# Altium schematic symbol library jlcpcb_2025_04_capacitors_extended_0402.schlib: 3594 symbols (part 18 of 20) (continued)
## TCC0402COG120K500AT
designator C?  Capacitance: 12pF  (hidden comment: *)
Capacitor, Ceramic (MLCC), 12pF, ±10%, 50V, C0G, ±10%, SMD 0402; Manufacturer: CCTC; Manufacturer Part Number: TCC0402COG120K500AT; Package Size: 0402; JLCPCB Basic Part: No; JLCPCB Part Number: C696905; Supplier 1: LCSC; Category: Capacitors - MLCC; Supplier Part Number 1: C696905; Tolerance: ±10%; Voltage Rating: 50V; Temperature Coefficient: C0G; RoHS: Yes; ComponentLink1Description: Datasheet; ComponentLink1URL: https://wmsc.lcsc.com/wmsc/upload/file/pdf/v2/lcsc/2304140030_CCTC-TCC0402COG120K500AT_C696905.pdf; ComponentLink2Description: JLCPCB Part URL; ComponentLink2URL: https://jlcpcb.com/partdetail/C696905; ComponentLink3Description: LCSC Part URL; ComponentLink3URL: https://lcsc.com/product-detail/Multilayer-Ceramic-Capacitors-MLCC---SMD-SMT_CCTC-CCTC-TCC0402COG120K500AT_C696905.html
footprint CAP-0402 (0402 (1005M) Capacitor)
pins: 1, 2

## TCC0402COG121J500AT
designator C?  Capacitance: 120pF  (hidden comment: *)
Capacitor, Ceramic (MLCC), 120pF, ±5%, 50V, ±5%, SMD 0402; Manufacturer: CCTC; Manufacturer Part Number: TCC0402COG121J500AT; Package Size: 0402; JLCPCB Basic Part: No; JLCPCB Part Number: C2887023; Supplier 1: LCSC; Category: Capacitors - MLCC; Supplier Part Number 1: C2887023; Tolerance: ±5%; Voltage Rating: 50V; RoHS: Yes; ComponentLink1Description: Datasheet; ComponentLink1URL: https://wmsc.lcsc.com/wmsc/upload/file/pdf/v2/lcsc/2108201430_CCTC-TCC0402COG121J500AT_C2887023.pdf; ComponentLink2Description: JLCPCB Part URL; ComponentLink2URL: https://jlcpcb.com/partdetail/C2887023; ComponentLink3Description: LCSC Part URL; ComponentLink3URL: https://lcsc.com/product-detail/Multilayer-Ceramic-Capacitors-MLCC---SMD-SMT_CCTC-CCTC-TCC0402COG121J500AT_C2887023.html
footprint CAP-0402 (0402 (1005M) Capacitor)
pins: 1, 2

## TCC0402COG150G500AT
designator C?  Capacitance: 15pF  (hidden comment: *)
Capacitor, Ceramic (MLCC), 15pF, ±2%, 50V, null, ±2%, SMD 0402; Manufacturer: CCTC; Manufacturer Part Number: TCC0402COG150G500AT; Package Size: 0402; JLCPCB Basic Part: No; JLCPCB Part Number: C5448865; Supplier 1: LCSC; Category: Capacitors - MLCC; Supplier Part Number 1: C5448865; Tolerance: ±2%; Voltage Rating: 50V; Temperature Coefficient: null; RoHS: Yes; ComponentLink1Description: Datasheet; ComponentLink2Description: JLCPCB Part URL; ComponentLink2URL: https://jlcpcb.com/partdetail/C5448865; ComponentLink3Description: LCSC Part URL; ComponentLink3URL: https://lcsc.com/product-detail/Multilayer-Ceramic-Capacitors-MLCC---SMD-SMT_CCTC-CCTC-TCC0402COG150G500AT_C5448865.html
footprint CAP-0402 (0402 (1005M) Capacitor)
pins: 1, 2

## TCC0402COG151J500AT
designator C?  Capacitance: 150pF  (hidden comment: *)
Capacitor, Ceramic (MLCC), 150pF, ±5%, 50V, C0G, ±5%, SMD 0402; Manufacturer: CCTC; Manufacturer Part Number: TCC0402COG151J500AT; Package Size: 0402; JLCPCB Basic Part: No; JLCPCB Part Number: C2994651; Supplier 1: LCSC; Category: Capacitors - MLCC; Supplier Part Number 1: C2994651; Tolerance: ±5%; Voltage Rating: 50V; Temperature Coefficient: C0G; RoHS: Yes; ComponentLink1Description: Datasheet; ComponentLink1URL: https://wmsc.lcsc.com/wmsc/upload/file/pdf/v2/lcsc/2204121745_CCTC-TCC0402COG151J500AT_C2994651.pdf; ComponentLink2Description: JLCPCB Part URL; ComponentLink2URL: https://jlcpcb.com/partdetail/C2994651; ComponentLink3Description: LCSC Part URL; ComponentLink3URL: https://lcsc.com/product-detail/Multilayer-Ceramic-Capacitors-MLCC---SMD-SMT_CCTC-CCTC-TCC0402COG151J500AT_C2994651.html
footprint CAP-0402 (0402 (1005M) Capacitor)
pins: 1, 2

## TCC0402COG160J500AT
designator C?  Capacitance: 16pF  (hidden comment: *)
Capacitor, Ceramic (MLCC), 16pF, ±5%, 50V, C0G, ±5%, SMD 0402; Manufacturer: CCTC; Manufacturer Part Number: TCC0402COG160J500AT; Package Size: 0402; JLCPCB Basic Part: No; JLCPCB Part Number: C5142569; Supplier 1: LCSC; Category: Capacitors - MLCC; Supplier Part Number 1: C5142569; Tolerance: ±5%; Voltage Rating: 50V; Temperature Coefficient: C0G; RoHS: Yes; ComponentLink1Description: Datasheet; ComponentLink1URL: https://wmsc.lcsc.com/wmsc/upload/file/pdf/v2/lcsc/2209011730_CCTC-TCC0402COG160J500AT_C5142569.pdf; ComponentLink2Description: JLCPCB Part URL; ComponentLink2URL: https://jlcpcb.com/partdetail/C5142569; ComponentLink3Description: LCSC Part URL; ComponentLink3URL: https://lcsc.com/product-detail/Multilayer-Ceramic-Capacitors-MLCC---SMD-SMT_CCTC-CCTC-TCC0402COG160J500AT_C5142569.html
footprint CAP-0402 (0402 (1005M) Capacitor)
pins: 1, 2

## TCC0402COG180J500AT
designator C?  Capacitance: 18pF  (hidden comment: *)
Capacitor, Ceramic (MLCC), 18pF, ±5%, 50V, C0G, ±5%, SMD 0402; Manufacturer: CCTC; Manufacturer Part Number: TCC0402COG180J500AT; Package Size: 0402; JLCPCB Basic Part: No; JLCPCB Part Number: C880644; Supplier 1: LCSC; Category: Capacitors - MLCC; Supplier Part Number 1: C880644; Tolerance: ±5%; Voltage Rating: 50V; Temperature Coefficient: C0G; RoHS: Yes; ComponentLink1Description: Datasheet; ComponentLink1URL: https://wmsc.lcsc.com/wmsc/upload/file/pdf/v2/lcsc/2304140030_CCTC-TCC0402COG180J500AT_C880644.pdf; ComponentLink2Description: JLCPCB Part URL; ComponentLink2URL: https://jlcpcb.com/partdetail/C880644; ComponentLink3Description: LCSC Part URL; ComponentLink3URL: https://lcsc.com/product-detail/Multilayer-Ceramic-Capacitors-MLCC---SMD-SMT_CCTC-CCTC-TCC0402COG180J500AT_C880644.html
footprint CAP-0402 (0402 (1005M) Capacitor)
pins: 1, 2

## TCC0402COG180K500AT
designator C?  Capacitance: 18pF  (hidden comment: *)
Capacitor, Ceramic (MLCC), 18pF, ±10%, 50V, null, ±10%, SMD 0402; Manufacturer: CCTC; Manufacturer Part Number: TCC0402COG180K500AT; Package Size: 0402; JLCPCB Basic Part: No; JLCPCB Part Number: C7393840; Supplier 1: LCSC; Category: Capacitors - MLCC; Supplier Part Number 1: C7393840; Tolerance: ±10%; Voltage Rating: 50V; Temperature Coefficient: null; RoHS: Yes; ComponentLink1Description: Datasheet; ComponentLink1URL: https://wmsc.lcsc.com/wmsc/upload/file/pdf/v2/lcsc/2306211554_CCTC-TCC0402COG180K500AT_C7393840.pdf; ComponentLink2Description: JLCPCB Part URL; ComponentLink2URL: https://jlcpcb.com/partdetail/C7393840; ComponentLink3Description: LCSC Part URL; ComponentLink3URL: https://lcsc.com/product-detail/Multilayer-Ceramic-Capacitors-MLCC---SMD-SMT_CCTC-CCTC-TCC0402COG180K500AT_C7393840.html
footprint CAP-0402 (0402 (1005M) Capacitor)
pins: 1, 2

## TCC0402COG200J500AT
designator C?  Capacitance: 20pF  (hidden comment: *)
Capacitor, Ceramic (MLCC), 20pF, ±5%, 50V, C0G, ±5%, SMD 0402; Manufacturer: CCTC; Manufacturer Part Number: TCC0402COG200J500AT; Package Size: 0402; JLCPCB Basic Part: No; JLCPCB Part Number: C880615; Supplier 1: LCSC; Category: Capacitors - MLCC; Supplier Part Number 1: C880615; Tolerance: ±5%; Voltage Rating: 50V; Temperature Coefficient: C0G; RoHS: Yes; ComponentLink1Description: Datasheet; ComponentLink1URL: https://wmsc.lcsc.com/wmsc/upload/file/pdf/v2/lcsc/2304140030_CCTC-TCC0402COG200J500AT_C880615.pdf; ComponentLink2Description: JLCPCB Part URL; ComponentLink2URL: https://jlcpcb.com/partdetail/C880615; ComponentLink3Description: LCSC Part URL; ComponentLink3URL: https://lcsc.com/product-detail/Multilayer-Ceramic-Capacitors-MLCC---SMD-SMT_CCTC-CCTC-TCC0402COG200J500AT_C880615.html
footprint CAP-0402 (0402 (1005M) Capacitor)
pins: 1, 2

## TCC0402COG200K500AT
designator C?  Capacitance: 20pF  (hidden comment: *)
Capacitor, Ceramic (MLCC), 20pF, ±10%, 50V, C0G, ±10%, SMD 0402; Manufacturer: CCTC; Manufacturer Part Number: TCC0402COG200K500AT; Package Size: 0402; JLCPCB Basic Part: No; JLCPCB Part Number: C696863; Supplier 1: LCSC; Category: Capacitors - MLCC; Supplier Part Number 1: C696863; Tolerance: ±10%; Voltage Rating: 50V; Temperature Coefficient: C0G; RoHS: Yes; ComponentLink1Description: Datasheet; ComponentLink1URL: https://wmsc.lcsc.com/wmsc/upload/file/pdf/v2/lcsc/2304140030_CCTC-TCC0402COG200K500AT_C696863.pdf; ComponentLink2Description: JLCPCB Part URL; ComponentLink2URL: https://jlcpcb.com/partdetail/C696863; ComponentLink3Description: LCSC Part URL; ComponentLink3URL: https://lcsc.com/product-detail/Multilayer-Ceramic-Capacitors-MLCC---SMD-SMT_CCTC-CCTC-TCC0402COG200K500AT_C696863.html
footprint CAP-0402 (0402 (1005M) Capacitor)
pins: 1, 2

## TCC0402COG220J500AT
designator C?  Capacitance: 22pF  (hidden comment: *)
Capacitor, Ceramic (MLCC), 22pF, ±5%, 50V, C0G, ±5%, SMD 0402; Manufacturer: CCTC; Manufacturer Part Number: TCC0402COG220J500AT; Package Size: 0402; JLCPCB Basic Part: No; JLCPCB Part Number: C696857; Supplier 1: LCSC; Category: Capacitors - MLCC; Supplier Part Number 1: C696857; Tolerance: ±5%; Voltage Rating: 50V; Temperature Coefficient: C0G; RoHS: Yes; ComponentLink1Description: Datasheet; ComponentLink1URL: https://wmsc.lcsc.com/wmsc/upload/file/pdf/v2/lcsc/2304140030_CCTC-TCC0402COG220J500AT_C696857.pdf; ComponentLink2Description: JLCPCB Part URL; ComponentLink2URL: https://jlcpcb.com/partdetail/C696857; ComponentLink3Description: LCSC Part URL; ComponentLink3URL: https://lcsc.com/product-detail/Multilayer-Ceramic-Capacitors-MLCC---SMD-SMT_CCTC-CCTC-TCC0402COG220J500AT_C696857.html
footprint CAP-0402 (0402 (1005M) Capacitor)
pins: 1, 2

## TCC0402COG220K500AT
designator C?  Capacitance: 22pF  (hidden comment: *)
Capacitor, Ceramic (MLCC), 22pF, ±10%, 50V, C0G, ±10%, SMD 0402; Manufacturer: CCTC; Manufacturer Part Number: TCC0402COG220K500AT; Package Size: 0402; JLCPCB Basic Part: No; JLCPCB Part Number: C696906; Supplier 1: LCSC; Category: Capacitors - MLCC; Supplier Part Number 1: C696906; Tolerance: ±10%; Voltage Rating: 50V; Temperature Coefficient: C0G; RoHS: Yes; ComponentLink1Description: Datasheet; ComponentLink1URL: https://wmsc.lcsc.com/wmsc/upload/file/pdf/v2/lcsc/2304140030_CCTC-TCC0402COG220K500AT_C696906.pdf; ComponentLink2Description: JLCPCB Part URL; ComponentLink2URL: https://jlcpcb.com/partdetail/C696906; ComponentLink3Description: LCSC Part URL; ComponentLink3URL: https://lcsc.com/product-detail/Multilayer-Ceramic-Capacitors-MLCC---SMD-SMT_CCTC-CCTC-TCC0402COG220K500AT_C696906.html
footprint CAP-0402 (0402 (1005M) Capacitor)
pins: 1, 2

## TCC0402COG221J500AT
designator C?  Capacitance: 220pF  (hidden comment: *)
Capacitor, Ceramic (MLCC), 220pF, ±5%, 50V, C0G, ±5%, SMD 0402; Manufacturer: CCTC; Manufacturer Part Number: TCC0402COG221J500AT; Package Size: 0402; JLCPCB Basic Part: No; JLCPCB Part Number: C2994655; Supplier 1: LCSC; Category: Capacitors - MLCC; Supplier Part Number 1: C2994655; Tolerance: ±5%; Voltage Rating: 50V; Temperature Coefficient: C0G; RoHS: Yes; ComponentLink1Description: Datasheet; ComponentLink1URL: https://wmsc.lcsc.com/wmsc/upload/file/pdf/v2/lcsc/2204121745_CCTC-TCC0402COG221J500AT_C2994655.pdf; ComponentLink2Description: JLCPCB Part URL; ComponentLink2URL: https://jlcpcb.com/partdetail/C2994655; ComponentLink3Description: LCSC Part URL; ComponentLink3URL: https://lcsc.com/product-detail/Multilayer-Ceramic-Capacitors-MLCC---SMD-SMT_CCTC-CCTC-TCC0402COG221J500AT_C2994655.html
footprint CAP-0402 (0402 (1005M) Capacitor)
pins: 1, 2

## TCC0402COG240J500AT
designator C?  Capacitance: 24pF  (hidden comment: *)
Capacitor, Ceramic (MLCC), 24pF, ±5%, 50V, C0G, ±5%, SMD 0402; Manufacturer: CCTC; Manufacturer Part Number: TCC0402COG240J500AT; Package Size: 0402; JLCPCB Basic Part: No; JLCPCB Part Number: C696899; Supplier 1: LCSC; Category: Capacitors - MLCC; Supplier Part Number 1: C696899; Tolerance: ±5%; Voltage Rating: 50V; Temperature Coefficient: C0G; RoHS: Yes; ComponentLink1Description: Datasheet; ComponentLink1URL: https://wmsc.lcsc.com/wmsc/upload/file/pdf/v2/lcsc/2304140030_CCTC-TCC0402COG240J500AT_C696899.pdf; ComponentLink2Description: JLCPCB Part URL; ComponentLink2URL: https://jlcpcb.com/partdetail/C696899; ComponentLink3Description: LCSC Part URL; ComponentLink3URL: https://lcsc.com/product-detail/Multilayer-Ceramic-Capacitors-MLCC---SMD-SMT_CCTC-CCTC-TCC0402COG240J500AT_C696899.html
footprint CAP-0402 (0402 (1005M) Capacitor)
pins: 1, 2

## TCC0402COG250J500AT
designator C?  Capacitance: 25pF  (hidden comment: *)
Capacitor, Ceramic (MLCC), 25pF, ±5%, 50V, C0G, ±5%, SMD 0402; Manufacturer: CCTC; Manufacturer Part Number: TCC0402COG250J500AT; Package Size: 0402; JLCPCB Basic Part: No; JLCPCB Part Number: C696896; Supplier 1: LCSC; Category: Capacitors - MLCC; Supplier Part Number 1: C696896; Tolerance: ±5%; Voltage Rating: 50V; Temperature Coefficient: C0G; RoHS: Yes; ComponentLink1Description: Datasheet; ComponentLink1URL: https://wmsc.lcsc.com/wmsc/upload/file/pdf/v2/lcsc/2304140030_CCTC-TCC0402COG250J500AT_C696896.pdf; ComponentLink2Description: JLCPCB Part URL; ComponentLink2URL: https://jlcpcb.com/partdetail/C696896; ComponentLink3Description: LCSC Part URL; ComponentLink3URL: https://lcsc.com/product-detail/Multilayer-Ceramic-Capacitors-MLCC---SMD-SMT_CCTC-CCTC-TCC0402COG250J500AT_C696896.html
footprint CAP-0402 (0402 (1005M) Capacitor)
pins: 1, 2

## TCC0402COG250K500AT
designator C?  Capacitance: 25pF  (hidden comment: *)
Capacitor, Ceramic (MLCC), 25pF, ±10%, 50V, C0G, ±10%, SMD 0402; Manufacturer: CCTC; Manufacturer Part Number: TCC0402COG250K500AT; Package Size: 0402; JLCPCB Basic Part: No; JLCPCB Part Number: C696895; Supplier 1: LCSC; Category: Capacitors - MLCC; Supplier Part Number 1: C696895; Tolerance: ±10%; Voltage Rating: 50V; Temperature Coefficient: C0G; RoHS: Yes; ComponentLink1Description: Datasheet; ComponentLink1URL: https://wmsc.lcsc.com/wmsc/upload/file/pdf/v2/lcsc/2304140030_CCTC-TCC0402COG250K500AT_C696895.pdf; ComponentLink2Description: JLCPCB Part URL; ComponentLink2URL: https://jlcpcb.com/partdetail/C696895; ComponentLink3Description: LCSC Part URL; ComponentLink3URL: https://lcsc.com/product-detail/Multilayer-Ceramic-Capacitors-MLCC---SMD-SMT_CCTC-CCTC-TCC0402COG250K500AT_C696895.html
footprint CAP-0402 (0402 (1005M) Capacitor)
pins: 1, 2

## TCC0402COG270K500AT
designator C?  Capacitance: 27pF  (hidden comment: *)
Capacitor, Ceramic (MLCC), 27pF, ±10%, 50V, null, ±10%, SMD 0402; Manufacturer: CCTC; Manufacturer Part Number: TCC0402COG270K500AT; Package Size: 0402; JLCPCB Basic Part: No; JLCPCB Part Number: C5448813; Supplier 1: LCSC; Category: Capacitors - MLCC; Supplier Part Number 1: C5448813; Tolerance: ±10%; Voltage Rating: 50V; Temperature Coefficient: null; RoHS: Yes; ComponentLink1Description: Datasheet; ComponentLink2Description: JLCPCB Part URL; ComponentLink2URL: https://jlcpcb.com/partdetail/C5448813; ComponentLink3Description: LCSC Part URL; ComponentLink3URL: https://lcsc.com/product-detail/Multilayer-Ceramic-Capacitors-MLCC---SMD-SMT_CCTC-CCTC-TCC0402COG270K500AT_C5448813.html
footprint CAP-0402 (0402 (1005M) Capacitor)
pins: 1, 2

## TCC0402COG300J500AT
designator C?  Capacitance: 30pF  (hidden comment: *)
Capacitor, Ceramic (MLCC), 30pF, ±5%, 50V, C0G, ±5%, SMD 0402; Manufacturer: CCTC; Manufacturer Part Number: TCC0402COG300J500AT; Package Size: 0402; JLCPCB Basic Part: No; JLCPCB Part Number: C696851; Supplier 1: LCSC; Category: Capacitors - MLCC; Supplier Part Number 1: C696851; Tolerance: ±5%; Voltage Rating: 50V; Temperature Coefficient: C0G; RoHS: Yes; ComponentLink1Description: Datasheet; ComponentLink1URL: https://wmsc.lcsc.com/wmsc/upload/file/pdf/v2/lcsc/2304140030_CCTC-TCC0402COG300J500AT_C696851.pdf; ComponentLink2Description: JLCPCB Part URL; ComponentLink2URL: https://jlcpcb.com/partdetail/C696851; ComponentLink3Description: LCSC Part URL; ComponentLink3URL: https://lcsc.com/product-detail/Multilayer-Ceramic-Capacitors-MLCC---SMD-SMT_CCTC-CCTC-TCC0402COG300J500AT_C696851.html
footprint CAP-0402 (0402 (1005M) Capacitor)
pins: 1, 2

## TCC0402COG330J500AT
designator C?  Capacitance: 33pF  (hidden comment: *)
Capacitor, Ceramic (MLCC), 33pF, ±5%, 50V, C0G, ±5%, SMD 0402; Manufacturer: CCTC; Manufacturer Part Number: TCC0402COG330J500AT; Package Size: 0402; JLCPCB Basic Part: No; JLCPCB Part Number: C696910; Supplier 1: LCSC; Category: Capacitors - MLCC; Supplier Part Number 1: C696910; Tolerance: ±5%; Voltage Rating: 50V; Temperature Coefficient: C0G; RoHS: Yes; ComponentLink1Description: Datasheet; ComponentLink1URL: https://wmsc.lcsc.com/wmsc/upload/file/pdf/v2/lcsc/2304140030_CCTC-TCC0402COG330J500AT_C696910.pdf; ComponentLink2Description: JLCPCB Part URL; ComponentLink2URL: https://jlcpcb.com/partdetail/C696910; ComponentLink3Description: LCSC Part URL; ComponentLink3URL: https://lcsc.com/product-detail/Multilayer-Ceramic-Capacitors-MLCC---SMD-SMT_CCTC-CCTC-TCC0402COG330J500AT_C696910.html
footprint CAP-0402 (0402 (1005M) Capacitor)
pins: 1, 2

## TCC0402COG360J500AT
designator C?  Capacitance: 36pF  (hidden comment: *)
Capacitor, Ceramic (MLCC), 36pF, ±5%, 50V, C0G, ±5%, SMD 0402; Manufacturer: CCTC; Manufacturer Part Number: TCC0402COG360J500AT; Package Size: 0402; JLCPCB Basic Part: No; JLCPCB Part Number: C880646; Supplier 1: LCSC; Category: Capacitors - MLCC; Supplier Part Number 1: C880646; Tolerance: ±5%; Voltage Rating: 50V; Temperature Coefficient: C0G; RoHS: Yes; ComponentLink1Description: Datasheet; ComponentLink1URL: https://wmsc.lcsc.com/wmsc/upload/file/pdf/v2/lcsc/2304140030_CCTC-TCC0402COG360J500AT_C880646.pdf; ComponentLink2Description: JLCPCB Part URL; ComponentLink2URL: https://jlcpcb.com/partdetail/C880646; ComponentLink3Description: LCSC Part URL; ComponentLink3URL: https://lcsc.com/product-detail/Multilayer-Ceramic-Capacitors-MLCC---SMD-SMT_CCTC-CCTC-TCC0402COG360J500AT_C880646.html
footprint CAP-0402 (0402 (1005M) Capacitor)
pins: 1, 2

## TCC0402COG390J500AT
designator C?  Capacitance: 39pF  (hidden comment: *)
Capacitor, Ceramic (MLCC), 39pF, ±5%, 50V, C0G, ±5%, SMD 0402; Manufacturer: CCTC; Manufacturer Part Number: TCC0402COG390J500AT; Package Size: 0402; JLCPCB Basic Part: No; JLCPCB Part Number: C696912; Supplier 1: LCSC; Category: Capacitors - MLCC; Supplier Part Number 1: C696912; Tolerance: ±5%; Voltage Rating: 50V; Temperature Coefficient: C0G; RoHS: Yes; ComponentLink1Description: Datasheet; ComponentLink1URL: https://wmsc.lcsc.com/wmsc/upload/file/pdf/v2/lcsc/2304140030_CCTC-TCC0402COG390J500AT_C696912.pdf; ComponentLink2Description: JLCPCB Part URL; ComponentLink2URL: https://jlcpcb.com/partdetail/C696912; ComponentLink3Description: LCSC Part URL; ComponentLink3URL: https://lcsc.com/product-detail/Multilayer-Ceramic-Capacitors-MLCC---SMD-SMT_CCTC-CCTC-TCC0402COG390J500AT_C696912.html
footprint CAP-0402 (0402 (1005M) Capacitor)
pins: 1, 2

## TCC0402COG390K500AT
designator C?  Capacitance: 39pF  (hidden comment: *)
Capacitor, Ceramic (MLCC), 39pF, ±10%, 50V, C0G, ±10%, SMD 0402; Manufacturer: CCTC; Manufacturer Part Number: TCC0402COG390K500AT; Package Size: 0402; JLCPCB Basic Part: No; JLCPCB Part Number: C696900; Supplier 1: LCSC; Category: Capacitors - MLCC; Supplier Part Number 1: C696900; Tolerance: ±10%; Voltage Rating: 50V; Temperature Coefficient: C0G; RoHS: Yes; ComponentLink1Description: Datasheet; ComponentLink1URL: https://wmsc.lcsc.com/wmsc/upload/file/pdf/v2/lcsc/2304140030_CCTC-TCC0402COG390K500AT_C696900.pdf; ComponentLink2Description: JLCPCB Part URL; ComponentLink2URL: https://jlcpcb.com/partdetail/C696900; ComponentLink3Description: LCSC Part URL; ComponentLink3URL: https://lcsc.com/product-detail/Multilayer-Ceramic-Capacitors-MLCC---SMD-SMT_CCTC-CCTC-TCC0402COG390K500AT_C696900.html
footprint CAP-0402 (0402 (1005M) Capacitor)
pins: 1, 2

## TCC0402COG470J500AT
designator C?  Capacitance: 47pF  (hidden comment: *)
Capacitor, Ceramic (MLCC), 47pF, ±5%, 50V, C0G, ±5%, SMD 0402; Manufacturer: CCTC; Manufacturer Part Number: TCC0402COG470J500AT; Package Size: 0402; JLCPCB Basic Part: No; JLCPCB Part Number: C880621; Supplier 1: LCSC; Category: Capacitors - MLCC; Supplier Part Number 1: C880621; Tolerance: ±5%; Voltage Rating: 50V; Temperature Coefficient: C0G; RoHS: Yes; ComponentLink1Description: Datasheet; ComponentLink1URL: https://wmsc.lcsc.com/wmsc/upload/file/pdf/v2/lcsc/2304140030_CCTC-TCC0402COG470J500AT_C880621.pdf; ComponentLink2Description: JLCPCB Part URL; ComponentLink2URL: https://jlcpcb.com/partdetail/C880621; ComponentLink3Description: LCSC Part URL; ComponentLink3URL: https://lcsc.com/product-detail/Multilayer-Ceramic-Capacitors-MLCC---SMD-SMT_CCTC-CCTC-TCC0402COG470J500AT_C880621.html
footprint CAP-0402 (0402 (1005M) Capacitor)
pins: 1, 2

## TCC0402COG560J500AT
designator C?  Capacitance: 56pF  (hidden comment: *)
Capacitor, Ceramic (MLCC), 56pF, ±5%, 50V, C0G, ±5%, SMD 0402; Manufacturer: CCTC; Manufacturer Part Number: TCC0402COG560J500AT; Package Size: 0402; JLCPCB Basic Part: No; JLCPCB Part Number: C696894; Supplier 1: LCSC; Category: Capacitors - MLCC; Supplier Part Number 1: C696894; Tolerance: ±5%; Voltage Rating: 50V; Temperature Coefficient: C0G; RoHS: Yes; ComponentLink1Description: Datasheet; ComponentLink1URL: https://wmsc.lcsc.com/wmsc/upload/file/pdf/v2/lcsc/2304140030_CCTC-TCC0402COG560J500AT_C696894.pdf; ComponentLink2Description: JLCPCB Part URL; ComponentLink2URL: https://jlcpcb.com/partdetail/C696894; ComponentLink3Description: LCSC Part URL; ComponentLink3URL: https://lcsc.com/product-detail/Multilayer-Ceramic-Capacitors-MLCC---SMD-SMT_CCTC-CCTC-TCC0402COG560J500AT_C696894.html
footprint CAP-0402 (0402 (1005M) Capacitor)
pins: 1, 2

## TCC0402COG680J500AT
designator C?  Capacitance: 68pF  (hidden comment: *)
Capacitor, Ceramic (MLCC), 68pF, ±5%, 50V, C0G, ±5%, SMD 0402; Manufacturer: CCTC; Manufacturer Part Number: TCC0402COG680J500AT; Package Size: 0402; JLCPCB Basic Part: No; JLCPCB Part Number: C696911; Supplier 1: LCSC; Category: Capacitors - MLCC; Supplier Part Number 1: C696911; Tolerance: ±5%; Voltage Rating: 50V; Temperature Coefficient: C0G; RoHS: Yes; ComponentLink1Description: Datasheet; ComponentLink1URL: https://wmsc.lcsc.com/wmsc/upload/file/pdf/v2/lcsc/2304140030_CCTC-TCC0402COG680J500AT_C696911.pdf; ComponentLink2Description: JLCPCB Part URL; ComponentLink2URL: https://jlcpcb.com/partdetail/C696911; ComponentLink3Description: LCSC Part URL; ComponentLink3URL: https://lcsc.com/product-detail/Multilayer-Ceramic-Capacitors-MLCC---SMD-SMT_CCTC-CCTC-TCC0402COG680J500AT_C696911.html
footprint CAP-0402 (0402 (1005M) Capacitor)
pins: 1, 2

## TCC0402COG680K500AT
designator C?  Capacitance: 68pF  (hidden comment: *)
Capacitor, Ceramic (MLCC), 68pF, ±10%, 50V, C0G, ±10%, SMD 0402; Manufacturer: CCTC; Manufacturer Part Number: TCC0402COG680K500AT; Package Size: 0402; JLCPCB Basic Part: No; JLCPCB Part Number: C696879; Supplier 1: LCSC; Category: Capacitors - MLCC; Supplier Part Number 1: C696879; Tolerance: ±10%; Voltage Rating: 50V; Temperature Coefficient: C0G; RoHS: Yes; ComponentLink1Description: Datasheet; ComponentLink1URL: https://wmsc.lcsc.com/wmsc/upload/file/pdf/v2/lcsc/2304140030_CCTC-TCC0402COG680K500AT_C696879.pdf; ComponentLink2Description: JLCPCB Part URL; ComponentLink2URL: https://jlcpcb.com/partdetail/C696879; ComponentLink3Description: LCSC Part URL; ComponentLink3URL: https://lcsc.com/product-detail/Multilayer-Ceramic-Capacitors-MLCC---SMD-SMT_CCTC-CCTC-TCC0402COG680K500AT_C696879.html
footprint CAP-0402 (0402 (1005M) Capacitor)
pins: 1, 2

## TCC0402COG820K500AT
designator C?  Capacitance: 82pF  (hidden comment: *)
Capacitor, Ceramic (MLCC), 82pF, ±10%, 50V, C0G, ±10%, SMD 0402; Manufacturer: CCTC; Manufacturer Part Number: TCC0402COG820K500AT; Package Size: 0402; JLCPCB Basic Part: No; JLCPCB Part Number: C696876; Supplier 1: LCSC; Category: Capacitors - MLCC; Supplier Part Number 1: C696876; Tolerance: ±10%; Voltage Rating: 50V; Temperature Coefficient: C0G; RoHS: Yes; ComponentLink1Description: Datasheet; ComponentLink1URL: https://wmsc.lcsc.com/wmsc/upload/file/pdf/v2/lcsc/2304140030_CCTC-TCC0402COG820K500AT_C696876.pdf; ComponentLink2Description: JLCPCB Part URL; ComponentLink2URL: https://jlcpcb.com/partdetail/C696876; ComponentLink3Description: LCSC Part URL; ComponentLink3URL: https://lcsc.com/product-detail/Multilayer-Ceramic-Capacitors-MLCC---SMD-SMT_CCTC-CCTC-TCC0402COG820K500AT_C696876.html
footprint CAP-0402 (0402 (1005M) Capacitor)
pins: 1, 2

## TCC0402COGR75C500AT
designator C?  Capacitance: 0.75pF  (hidden comment: *)
Capacitor, Ceramic (MLCC), 0.75pF, 50V, C0G, SMD 0402; Manufacturer: CCTC; Manufacturer Part Number: TCC0402COGR75C500AT; Package Size: 0402; JLCPCB Basic Part: No; JLCPCB Part Number: C5142575; Supplier 1: LCSC; Category: Capacitors - MLCC; Supplier Part Number 1: C5142575; Voltage Rating: 50V; Temperature Coefficient: C0G; RoHS: Yes; ComponentLink1Description: Datasheet; ComponentLink1URL: https://wmsc.lcsc.com/wmsc/upload/file/pdf/v2/lcsc/2209011730_CCTC-TCC0402COGR75C500AT_C5142575.pdf; ComponentLink2Description: JLCPCB Part URL; ComponentLink2URL: https://jlcpcb.com/partdetail/C5142575; ComponentLink3Description: LCSC Part URL; ComponentLink3URL: https://lcsc.com/product-detail/Multilayer-Ceramic-Capacitors-MLCC---SMD-SMT_CCTC-CCTC-TCC0402COGR75C500AT_C5142575.html
footprint CAP-0402 (0402 (1005M) Capacitor)
pins: 1, 2

## TCC0402X5R104K100AT
designator C?  Capacitance: 100nF  (hidden comment: *)
Capacitor, Ceramic (MLCC), 100nF, ±10%, 10V, X5R, ±10%, SMD 0402; Manufacturer: CCTC; Manufacturer Part Number: TCC0402X5R104K100AT; Package Size: 0402; JLCPCB Basic Part: No; JLCPCB Part Number: C2932181; Supplier 1: LCSC; Category: Capacitors - MLCC; Supplier Part Number 1: C2932181; Tolerance: ±10%; Voltage Rating: 10V; Temperature Coefficient: X5R; RoHS: Yes; ComponentLink1Description: Datasheet; ComponentLink1URL: https://wmsc.lcsc.com/wmsc/upload/file/pdf/v2/lcsc/2201121530_CCTC-TCC0402X5R104K100AT_C2932181.pdf; ComponentLink2Description: JLCPCB Part URL; ComponentLink2URL: https://jlcpcb.com/partdetail/C2932181; ComponentLink3Description: LCSC Part URL; ComponentLink3URL: https://lcsc.com/product-detail/Multilayer-Ceramic-Capacitors-MLCC---SMD-SMT_CCTC-CCTC-TCC0402X5R104K100AT_C2932181.html
footprint CAP-0402 (0402 (1005M) Capacitor)
pins: 1, 2

## TCC0402X5R104K160AT
designator C?  Capacitance: 100nF  (hidden comment: *)
Capacitor, Ceramic (MLCC), 100nF, ±10%, 16V, X5R, ±10%, SMD 0402; Manufacturer: CCTC; Manufacturer Part Number: TCC0402X5R104K160AT; Package Size: 0402; JLCPCB Basic Part: No; JLCPCB Part Number: C344189; Supplier 1: LCSC; Category: Capacitors - MLCC; Supplier Part Number 1: C344189; Tolerance: ±10%; Voltage Rating: 16V; Temperature Coefficient: X5R; RoHS: Yes; ComponentLink1Description: Datasheet; ComponentLink1URL: https://wmsc.lcsc.com/wmsc/upload/file/pdf/v2/lcsc/2304140030_CCTC-TCC0402X5R104K160AT_C344189.pdf; ComponentLink2Description: JLCPCB Part URL; ComponentLink2URL: https://jlcpcb.com/partdetail/C344189; ComponentLink3Description: LCSC Part URL; ComponentLink3URL: https://lcsc.com/product-detail/Multilayer-Ceramic-Capacitors-MLCC---SMD-SMT_CCTC-CCTC-TCC0402X5R104K160AT_C344189.html
footprint CAP-0402 (0402 (1005M) Capacitor)
pins: 1, 2

## TCC0402X5R104K250AT
designator C?  Capacitance: 100nF  (hidden comment: *)
Capacitor, Ceramic (MLCC), 100nF, ±10%, 25V, X5R, ±10%, SMD 0402; Manufacturer: CCTC; Manufacturer Part Number: TCC0402X5R104K250AT; Package Size: 0402; JLCPCB Basic Part: No; JLCPCB Part Number: C880603; Supplier 1: LCSC; Category: Capacitors - MLCC; Supplier Part Number 1: C880603; Tolerance: ±10%; Voltage Rating: 25V; Temperature Coefficient: X5R; RoHS: Yes; ComponentLink1Description: Datasheet; ComponentLink1URL: https://wmsc.lcsc.com/wmsc/upload/file/pdf/v2/lcsc/2304140030_CCTC-TCC0402X5R104K250AT_C880603.pdf; ComponentLink2Description: JLCPCB Part URL; ComponentLink2URL: https://jlcpcb.com/partdetail/C880603; ComponentLink3Description: LCSC Part URL; ComponentLink3URL: https://lcsc.com/product-detail/Multilayer-Ceramic-Capacitors-MLCC---SMD-SMT_CCTC-CCTC-TCC0402X5R104K250AT_C880603.html
footprint CAP-0402 (0402 (1005M) Capacitor)
pins: 1, 2

## TCC0402X5R104K500AT
designator C?  Capacitance: 100000pF  (hidden comment: *)
Capacitor, Ceramic (MLCC), 100000pF, ±10%, 50V, X5R, ±10%, SMD 0402; Manufacturer: CCTC; Manufacturer Part Number: TCC0402X5R104K500AT; Package Size: 0402; JLCPCB Basic Part: No; JLCPCB Part Number: C5142579; Supplier 1: LCSC; Category: Capacitors - MLCC; Supplier Part Number 1: C5142579; Tolerance: ±10%; Voltage Rating: 50V; Temperature Coefficient: X5R; RoHS: Yes; ComponentLink1Description: Datasheet; ComponentLink1URL: https://wmsc.lcsc.com/wmsc/upload/file/pdf/v2/lcsc/2209011730_CCTC-TCC0402X5R104K500AT_C5142579.pdf; ComponentLink2Description: JLCPCB Part URL; ComponentLink2URL: https://jlcpcb.com/partdetail/C5142579; ComponentLink3Description: LCSC Part URL; ComponentLink3URL: https://lcsc.com/product-detail/Multilayer-Ceramic-Capacitors-MLCC---SMD-SMT_CCTC-CCTC-TCC0402X5R104K500AT_C5142579.html
footprint CAP-0402 (0402 (1005M) Capacitor)
pins: 1, 2

## TCC0402X5R104M160AT
designator C?  Capacitance: 100nF  (hidden comment: *)
Capacitor, Ceramic (MLCC), 100nF, ±20%, 16V, X5R, ±20%, SMD 0402; Manufacturer: CCTC; Manufacturer Part Number: TCC0402X5R104M160AT; Package Size: 0402; JLCPCB Basic Part: No; JLCPCB Part Number: C344190; Supplier 1: LCSC; Category: Capacitors - MLCC; Supplier Part Number 1: C344190; Tolerance: ±20%; Voltage Rating: 16V; Temperature Coefficient: X5R; RoHS: Yes; ComponentLink1Description: Datasheet; ComponentLink1URL: https://wmsc.lcsc.com/wmsc/upload/file/pdf/v2/lcsc/2304140030_CCTC-TCC0402X5R104M160AT_C344190.pdf; ComponentLink2Description: JLCPCB Part URL; ComponentLink2URL: https://jlcpcb.com/partdetail/C344190; ComponentLink3Description: LCSC Part URL; ComponentLink3URL: https://lcsc.com/product-detail/Multilayer-Ceramic-Capacitors-MLCC---SMD-SMT_CCTC-CCTC-TCC0402X5R104M160AT_C344190.html
footprint CAP-0402 (0402 (1005M) Capacitor)
pins: 1, 2

## TCC0402X5R104M250AT
designator C?  Capacitance: 100nF  (hidden comment: *)
Capacitor, Ceramic (MLCC), 100nF, ±20%, 25V, X5R, ±20%, SMD 0402; Manufacturer: CCTC; Manufacturer Part Number: TCC0402X5R104M250AT; Package Size: 0402; JLCPCB Basic Part: No; JLCPCB Part Number: C359190; Supplier 1: LCSC; Category: Capacitors - MLCC; Supplier Part Number 1: C359190; Tolerance: ±20%; Voltage Rating: 25V; Temperature Coefficient: X5R; RoHS: Yes; ComponentLink1Description: Datasheet; ComponentLink1URL: https://wmsc.lcsc.com/wmsc/upload/file/pdf/v2/lcsc/2304140030_CCTC-TCC0402X5R104M250AT_C359190.pdf; ComponentLink2Description: JLCPCB Part URL; ComponentLink2URL: https://jlcpcb.com/partdetail/C359190; ComponentLink3Description: LCSC Part URL; ComponentLink3URL: https://lcsc.com/product-detail/Multilayer-Ceramic-Capacitors-MLCC---SMD-SMT_CCTC-CCTC-TCC0402X5R104M250AT_C359190.html
footprint CAP-0402 (0402 (1005M) Capacitor)
pins: 1, 2

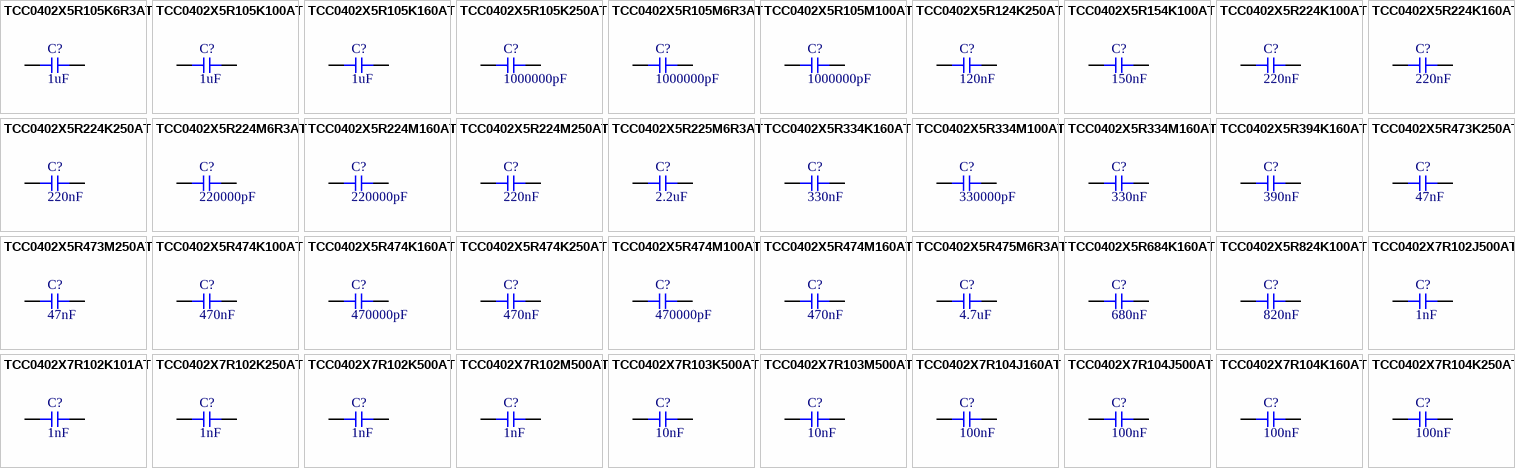
[diagram p83: symbols TCC0402X5R105K6R3AT to TCC0402X7R104K250AT]

## TCC0402X5R105K6R3AT
designator C?  Capacitance: 1uF  (hidden comment: *)
Capacitor, Ceramic (MLCC), 1uF, ±10%, 6.3V, X5R, ±10%, SMD 0402; Manufacturer: CCTC; Manufacturer Part Number: TCC0402X5R105K6R3AT; Package Size: 0402; JLCPCB Basic Part: No; JLCPCB Part Number: C380294; Supplier 1: LCSC; Category: Capacitors - MLCC; Supplier Part Number 1: C380294; Tolerance: ±10%; Voltage Rating: 6.3V; Temperature Coefficient: X5R; RoHS: Yes; ComponentLink1Description: Datasheet; ComponentLink1URL: https://wmsc.lcsc.com/wmsc/upload/file/pdf/v2/lcsc/2304140030_CCTC-TCC0402X5R105K6R3AT_C380294.pdf; ComponentLink2Description: JLCPCB Part URL; ComponentLink2URL: https://jlcpcb.com/partdetail/C380294; ComponentLink3Description: LCSC Part URL; ComponentLink3URL: https://lcsc.com/product-detail/Multilayer-Ceramic-Capacitors-MLCC---SMD-SMT_CCTC-CCTC-TCC0402X5R105K6R3AT_C380294.html
footprint CAP-0402 (0402 (1005M) Capacitor)
pins: 1, 2

## TCC0402X5R105K100AT
designator C?  Capacitance: 1uF  (hidden comment: *)
Capacitor, Ceramic (MLCC), 1uF, ±10%, 10V, X5R, ±10%, SMD 0402; Manufacturer: CCTC; Manufacturer Part Number: TCC0402X5R105K100AT; Package Size: 0402; JLCPCB Basic Part: No; JLCPCB Part Number: C380293; Supplier 1: LCSC; Category: Capacitors - MLCC; Supplier Part Number 1: C380293; Tolerance: ±10%; Voltage Rating: 10V; Temperature Coefficient: X5R; RoHS: Yes; ComponentLink1Description: Datasheet; ComponentLink1URL: https://wmsc.lcsc.com/wmsc/upload/file/pdf/v2/lcsc/2304140030_CCTC-TCC0402X5R105K100AT_C380293.pdf; ComponentLink2Description: JLCPCB Part URL; ComponentLink2URL: https://jlcpcb.com/partdetail/C380293; ComponentLink3Description: LCSC Part URL; ComponentLink3URL: https://lcsc.com/product-detail/Multilayer-Ceramic-Capacitors-MLCC---SMD-SMT_CCTC-CCTC-TCC0402X5R105K100AT_C380293.html
footprint CAP-0402 (0402 (1005M) Capacitor)
pins: 1, 2

## TCC0402X5R105K160AT
designator C?  Capacitance: 1uF  (hidden comment: *)
Capacitor, Ceramic (MLCC), 1uF, ±10%, 16V, X5R, ±10%, SMD 0402; Manufacturer: CCTC; Manufacturer Part Number: TCC0402X5R105K160AT; Package Size: 0402; JLCPCB Basic Part: No; JLCPCB Part Number: C5142580; Supplier 1: LCSC; Category: Capacitors - MLCC; Supplier Part Number 1: C5142580; Tolerance: ±10%; Voltage Rating: 16V; Temperature Coefficient: X5R; RoHS: Yes; ComponentLink1Description: Datasheet; ComponentLink1URL: https://wmsc.lcsc.com/wmsc/upload/file/pdf/v2/lcsc/2209011730_CCTC-TCC0402X5R105K160AT_C5142580.pdf; ComponentLink2Description: JLCPCB Part URL; ComponentLink2URL: https://jlcpcb.com/partdetail/C5142580; ComponentLink3Description: LCSC Part URL; ComponentLink3URL: https://lcsc.com/product-detail/Multilayer-Ceramic-Capacitors-MLCC---SMD-SMT_CCTC-CCTC-TCC0402X5R105K160AT_C5142580.html
footprint CAP-0402 (0402 (1005M) Capacitor)
pins: 1, 2

## TCC0402X5R105K250AT
designator C?  Capacitance: 1000000pF  (hidden comment: *)
Capacitor, Ceramic (MLCC), 1000000pF, ±10%, 25V, X5R, ±10%, SMD 0402; Manufacturer: CCTC; Manufacturer Part Number: TCC0402X5R105K250AT; Package Size: 0402; JLCPCB Basic Part: No; JLCPCB Part Number: C5359886; Supplier 1: LCSC; Category: Capacitors - MLCC; Supplier Part Number 1: C5359886; Tolerance: ±10%; Voltage Rating: 25V; Temperature Coefficient: X5R; RoHS: Yes; ComponentLink1Description: Datasheet; ComponentLink1URL: https://wmsc.lcsc.com/wmsc/upload/file/pdf/v2/lcsc/2302141837_CCTC-TCC0402X5R105K250AT_C5359886.pdf; ComponentLink2Description: JLCPCB Part URL; ComponentLink2URL: https://jlcpcb.com/partdetail/C5359886; ComponentLink3Description: LCSC Part URL; ComponentLink3URL: https://lcsc.com/product-detail/Multilayer-Ceramic-Capacitors-MLCC---SMD-SMT_CCTC-CCTC-TCC0402X5R105K250AT_C5359886.html
footprint CAP-0402 (0402 (1005M) Capacitor)
pins: 1, 2

## TCC0402X5R105M6R3AT
designator C?  Capacitance: 1000000pF  (hidden comment: *)
Capacitor, Ceramic (MLCC), 1000000pF, ±20%, 6.3V, X5R, ±20%, SMD 0402; Manufacturer: CCTC; Manufacturer Part Number: TCC0402X5R105M6R3AT; Package Size: 0402; JLCPCB Basic Part: No; JLCPCB Part Number: C2887021; Supplier 1: LCSC; Category: Capacitors - MLCC; Supplier Part Number 1: C2887021; Tolerance: ±20%; Voltage Rating: 6.3V; Temperature Coefficient: X5R; RoHS: Yes; ComponentLink1Description: Datasheet; ComponentLink1URL: https://wmsc.lcsc.com/wmsc/upload/file/pdf/v2/lcsc/2108201530_CCTC-TCC0402X5R105M6R3AT_C2887021.pdf; ComponentLink2Description: JLCPCB Part URL; ComponentLink2URL: https://jlcpcb.com/partdetail/C2887021; ComponentLink3Description: LCSC Part URL; ComponentLink3URL: https://lcsc.com/product-detail/Multilayer-Ceramic-Capacitors-MLCC---SMD-SMT_CCTC-CCTC-TCC0402X5R105M6R3AT_C2887021.html
footprint CAP-0402 (0402 (1005M) Capacitor)
pins: 1, 2

## TCC0402X5R105M100AT
designator C?  Capacitance: 1000000pF  (hidden comment: *)
Capacitor, Ceramic (MLCC), 1000000pF, ±20%, 10V, X5R, ±20%, SMD 0402; Manufacturer: CCTC; Manufacturer Part Number: TCC0402X5R105M100AT; Package Size: 0402; JLCPCB Basic Part: No; JLCPCB Part Number: C2887020; Supplier 1: LCSC; Category: Capacitors - MLCC; Supplier Part Number 1: C2887020; Tolerance: ±20%; Voltage Rating: 10V; Temperature Coefficient: X5R; RoHS: Yes; ComponentLink1Description: Datasheet; ComponentLink1URL: https://wmsc.lcsc.com/wmsc/upload/file/pdf/v2/lcsc/2108201430_CCTC-TCC0402X5R105M100AT_C2887020.pdf; ComponentLink2Description: JLCPCB Part URL; ComponentLink2URL: https://jlcpcb.com/partdetail/C2887020; ComponentLink3Description: LCSC Part URL; ComponentLink3URL: https://lcsc.com/product-detail/Multilayer-Ceramic-Capacitors-MLCC---SMD-SMT_CCTC-CCTC-TCC0402X5R105M100AT_C2887020.html
footprint CAP-0402 (0402 (1005M) Capacitor)
pins: 1, 2

## TCC0402X5R124K250AT
designator C?  Capacitance: 120nF  (hidden comment: *)
Capacitor, Ceramic (MLCC), 120nF, ±10%, 25V, X5R, ±10%, SMD 0402; Manufacturer: CCTC; Manufacturer Part Number: TCC0402X5R124K250AT; Package Size: 0402; JLCPCB Basic Part: No; JLCPCB Part Number: C7393853; Supplier 1: LCSC; Category: Capacitors - MLCC; Supplier Part Number 1: C7393853; Tolerance: ±10%; Voltage Rating: 25V; Temperature Coefficient: X5R; RoHS: Yes; ComponentLink1Description: Datasheet; ComponentLink1URL: https://wmsc.lcsc.com/wmsc/upload/file/pdf/v2/lcsc/2306211554_CCTC-TCC0402X5R124K250AT_C7393853.pdf; ComponentLink2Description: JLCPCB Part URL; ComponentLink2URL: https://jlcpcb.com/partdetail/C7393853; ComponentLink3Description: LCSC Part URL; ComponentLink3URL: https://lcsc.com/product-detail/Multilayer-Ceramic-Capacitors-MLCC---SMD-SMT_CCTC-CCTC-TCC0402X5R124K250AT_C7393853.html
footprint CAP-0402 (0402 (1005M) Capacitor)
pins: 1, 2

## TCC0402X5R154K100AT
designator C?  Capacitance: 150nF  (hidden comment: *)
Capacitor, Ceramic (MLCC), 150nF, ±10%, 10V, X5R, ±10%, SMD 0402; Manufacturer: CCTC; Manufacturer Part Number: TCC0402X5R154K100AT; Package Size: 0402; JLCPCB Basic Part: No; JLCPCB Part Number: C380295; Supplier 1: LCSC; Category: Capacitors - MLCC; Supplier Part Number 1: C380295; Tolerance: ±10%; Voltage Rating: 10V; Temperature Coefficient: X5R; RoHS: Yes; ComponentLink1Description: Datasheet; ComponentLink1URL: https://wmsc.lcsc.com/wmsc/upload/file/pdf/v2/lcsc/2304140030_CCTC-TCC0402X5R154K100AT_C380295.pdf; ComponentLink2Description: JLCPCB Part URL; ComponentLink2URL: https://jlcpcb.com/partdetail/C380295; ComponentLink3Description: LCSC Part URL; ComponentLink3URL: https://lcsc.com/product-detail/Multilayer-Ceramic-Capacitors-MLCC---SMD-SMT_CCTC-CCTC-TCC0402X5R154K100AT_C380295.html
footprint CAP-0402 (0402 (1005M) Capacitor)
pins: 1, 2

## TCC0402X5R224K100AT
designator C?  Capacitance: 220nF  (hidden comment: *)
Capacitor, Ceramic (MLCC), 220nF, ±10%, 10V, X5R, ±10%, SMD 0402; Manufacturer: CCTC; Manufacturer Part Number: TCC0402X5R224K100AT; Package Size: 0402; JLCPCB Basic Part: No; JLCPCB Part Number: C380296; Supplier 1: LCSC; Category: Capacitors - MLCC; Supplier Part Number 1: C380296; Tolerance: ±10%; Voltage Rating: 10V; Temperature Coefficient: X5R; RoHS: Yes; ComponentLink1Description: Datasheet; ComponentLink1URL: https://wmsc.lcsc.com/wmsc/upload/file/pdf/v2/lcsc/2304140030_CCTC-TCC0402X5R224K100AT_C380296.pdf; ComponentLink2Description: JLCPCB Part URL; ComponentLink2URL: https://jlcpcb.com/partdetail/C380296; ComponentLink3Description: LCSC Part URL; ComponentLink3URL: https://lcsc.com/product-detail/Multilayer-Ceramic-Capacitors-MLCC---SMD-SMT_CCTC-CCTC-TCC0402X5R224K100AT_C380296.html
footprint CAP-0402 (0402 (1005M) Capacitor)
pins: 1, 2

## TCC0402X5R224K160AT
designator C?  Capacitance: 220nF  (hidden comment: *)
Capacitor, Ceramic (MLCC), 220nF, ±10%, 16V, X5R, ±10%, SMD 0402; Manufacturer: CCTC; Manufacturer Part Number: TCC0402X5R224K160AT; Package Size: 0402; JLCPCB Basic Part: No; JLCPCB Part Number: C380297; Supplier 1: LCSC; Category: Capacitors - MLCC; Supplier Part Number 1: C380297; Tolerance: ±10%; Voltage Rating: 16V; Temperature Coefficient: X5R; RoHS: Yes; ComponentLink1Description: Datasheet; ComponentLink1URL: https://wmsc.lcsc.com/wmsc/upload/file/pdf/v2/lcsc/2304140030_CCTC-TCC0402X5R224K160AT_C380297.pdf; ComponentLink2Description: JLCPCB Part URL; ComponentLink2URL: https://jlcpcb.com/partdetail/C380297; ComponentLink3Description: LCSC Part URL; ComponentLink3URL: https://lcsc.com/product-detail/Multilayer-Ceramic-Capacitors-MLCC---SMD-SMT_CCTC-CCTC-TCC0402X5R224K160AT_C380297.html
footprint CAP-0402 (0402 (1005M) Capacitor)
pins: 1, 2

## TCC0402X5R224K250AT
designator C?  Capacitance: 220nF  (hidden comment: *)
Capacitor, Ceramic (MLCC), 220nF, ±10%, 25V, X5R, ±10%, SMD 0402; Manufacturer: CCTC; Manufacturer Part Number: TCC0402X5R224K250AT; Package Size: 0402; JLCPCB Basic Part: No; JLCPCB Part Number: C696844; Supplier 1: LCSC; Category: Capacitors - MLCC; Supplier Part Number 1: C696844; Tolerance: ±10%; Voltage Rating: 25V; Temperature Coefficient: X5R; RoHS: Yes; ComponentLink1Description: Datasheet; ComponentLink1URL: https://wmsc.lcsc.com/wmsc/upload/file/pdf/v2/lcsc/2304140030_CCTC-TCC0402X5R224K250AT_C696844.pdf; ComponentLink2Description: JLCPCB Part URL; ComponentLink2URL: https://jlcpcb.com/partdetail/C696844; ComponentLink3Description: LCSC Part URL; ComponentLink3URL: https://lcsc.com/product-detail/Multilayer-Ceramic-Capacitors-MLCC---SMD-SMT_CCTC-CCTC-TCC0402X5R224K250AT_C696844.html
footprint CAP-0402 (0402 (1005M) Capacitor)
pins: 1, 2

## TCC0402X5R224M6R3AT
designator C?  Capacitance: 220000pF  (hidden comment: *)
Capacitor, Ceramic (MLCC), 220000pF, ±20%, 6.3V, X5R, ±20%, SMD 0402; Manufacturer: CCTC; Manufacturer Part Number: TCC0402X5R224M6R3AT; Package Size: 0402; JLCPCB Basic Part: No; JLCPCB Part Number: C5142568; Supplier 1: LCSC; Category: Capacitors - MLCC; Supplier Part Number 1: C5142568; Tolerance: ±20%; Voltage Rating: 6.3V; Temperature Coefficient: X5R; RoHS: Yes; ComponentLink1Description: Datasheet; ComponentLink1URL: https://wmsc.lcsc.com/wmsc/upload/file/pdf/v2/lcsc/2209011730_CCTC-TCC0402X5R224M6R3AT_C5142568.pdf; ComponentLink2Description: JLCPCB Part URL; ComponentLink2URL: https://jlcpcb.com/partdetail/C5142568; ComponentLink3Description: LCSC Part URL; ComponentLink3URL: https://lcsc.com/product-detail/Multilayer-Ceramic-Capacitors-MLCC---SMD-SMT_CCTC-CCTC-TCC0402X5R224M6R3AT_C5142568.html
footprint CAP-0402 (0402 (1005M) Capacitor)
pins: 1, 2

## TCC0402X5R224M160AT
designator C?  Capacitance: 220000pF  (hidden comment: *)
Capacitor, Ceramic (MLCC), 220000pF, ±20%, 16V, X5R, ±20%, SMD 0402; Manufacturer: CCTC; Manufacturer Part Number: TCC0402X5R224M160AT; Package Size: 0402; JLCPCB Basic Part: No; JLCPCB Part Number: C880606; Supplier 1: LCSC; Category: Capacitors - MLCC; Supplier Part Number 1: C880606; Tolerance: ±20%; Voltage Rating: 16V; Temperature Coefficient: X5R; RoHS: Yes; ComponentLink1Description: Datasheet; ComponentLink1URL: https://wmsc.lcsc.com/wmsc/upload/file/pdf/v2/lcsc/2304140030_CCTC-TCC0402X5R224M160AT_C880606.pdf; ComponentLink2Description: JLCPCB Part URL; ComponentLink2URL: https://jlcpcb.com/partdetail/C880606; ComponentLink3Description: LCSC Part URL; ComponentLink3URL: https://lcsc.com/product-detail/Multilayer-Ceramic-Capacitors-MLCC---SMD-SMT_CCTC-CCTC-TCC0402X5R224M160AT_C880606.html
footprint CAP-0402 (0402 (1005M) Capacitor)
pins: 1, 2

## TCC0402X5R224M250AT
designator C?  Capacitance: 220nF  (hidden comment: *)
Capacitor, Ceramic (MLCC), 220nF, ±20%, 25V, X5R, ±20%, SMD 0402; Manufacturer: CCTC; Manufacturer Part Number: TCC0402X5R224M250AT; Package Size: 0402; JLCPCB Basic Part: No; JLCPCB Part Number: C696915; Supplier 1: LCSC; Category: Capacitors - MLCC; Supplier Part Number 1: C696915; Tolerance: ±20%; Voltage Rating: 25V; Temperature Coefficient: X5R; RoHS: Yes; ComponentLink1Description: Datasheet; ComponentLink1URL: https://wmsc.lcsc.com/wmsc/upload/file/pdf/v2/lcsc/2304140030_CCTC-TCC0402X5R224M250AT_C696915.pdf; ComponentLink2Description: JLCPCB Part URL; ComponentLink2URL: https://jlcpcb.com/partdetail/C696915; ComponentLink3Description: LCSC Part URL; ComponentLink3URL: https://lcsc.com/product-detail/Multilayer-Ceramic-Capacitors-MLCC---SMD-SMT_CCTC-CCTC-TCC0402X5R224M250AT_C696915.html
footprint CAP-0402 (0402 (1005M) Capacitor)
pins: 1, 2

## TCC0402X5R225M6R3AT
designator C?  Capacitance: 2.2uF  (hidden comment: *)
Capacitor, Ceramic (MLCC), 2.2uF, ±20%, 6.3V, X5R, ±20%, SMD 0402; Manufacturer: CCTC; Manufacturer Part Number: TCC0402X5R225M6R3AT; Package Size: 0402; JLCPCB Basic Part: No; JLCPCB Part Number: C380298; Supplier 1: LCSC; Category: Capacitors - MLCC; Supplier Part Number 1: C380298; Tolerance: ±20%; Voltage Rating: 6.3V; Temperature Coefficient: X5R; RoHS: Yes; ComponentLink1Description: Datasheet; ComponentLink1URL: https://wmsc.lcsc.com/wmsc/upload/file/pdf/v2/lcsc/2304140030_CCTC-TCC0402X5R225M6R3AT_C380298.pdf; ComponentLink2Description: JLCPCB Part URL; ComponentLink2URL: https://jlcpcb.com/partdetail/C380298; ComponentLink3Description: LCSC Part URL; ComponentLink3URL: https://lcsc.com/product-detail/Multilayer-Ceramic-Capacitors-MLCC---SMD-SMT_CCTC-CCTC-TCC0402X5R225M6R3AT_C380298.html
footprint CAP-0402 (0402 (1005M) Capacitor)
pins: 1, 2

## TCC0402X5R334K160AT
designator C?  Capacitance: 330nF  (hidden comment: *)
Capacitor, Ceramic (MLCC), 330nF, ±10%, 16V, X5R, ±10%, SMD 0402; Manufacturer: CCTC; Manufacturer Part Number: TCC0402X5R334K160AT; Package Size: 0402; JLCPCB Basic Part: No; JLCPCB Part Number: C5448812; Supplier 1: LCSC; Category: Capacitors - MLCC; Supplier Part Number 1: C5448812; Tolerance: ±10%; Voltage Rating: 16V; Temperature Coefficient: X5R; RoHS: Yes; ComponentLink1Description: Datasheet; ComponentLink1URL: https://wmsc.lcsc.com/wmsc/upload/file/pdf/v2/lcsc/2403281711_CCTC-TCC0402X5R334K160AT_C5448812.pdf; ComponentLink2Description: JLCPCB Part URL; ComponentLink2URL: https://jlcpcb.com/partdetail/C5448812; ComponentLink3Description: LCSC Part URL; ComponentLink3URL: https://lcsc.com/product-detail/Multilayer-Ceramic-Capacitors-MLCC---SMD-SMT_CCTC-CCTC-TCC0402X5R334K160AT_C5448812.html
footprint CAP-0402 (0402 (1005M) Capacitor)
pins: 1, 2